# Altium footprint library CONN_B2B.PcbLib: 27 footprints (part 3 of 3)
Each footprint in its own frame and in the unit in brackets; x right, y up, seen from the top. Pads: shape width x height; smd on the part's side, far side on the other; paste and mask are expansions set on the pad; w line width, h text height; cw(c..) or ccw(c..) is an arc to the next point about the centre after c.
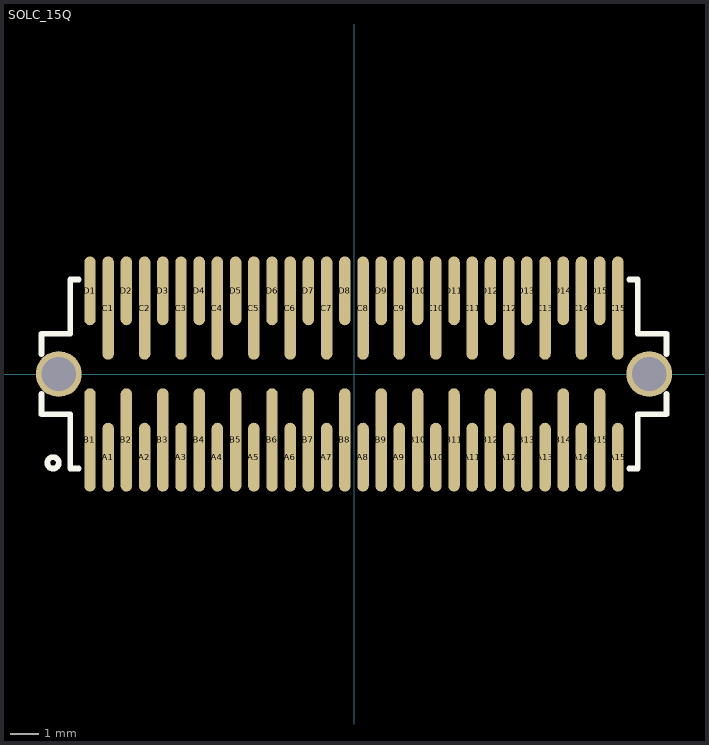
[diagram p2: the footprint, top view; thin cyan lines are the x and y axes]

## SOLC_15Q [mm] "SAMTEC SOLC-115-02-S-Q-LC"
height 0.6
pads (62):
  oval 0.4x2.4 smd: A1(-8.575,-2.9) A2(-7.305,-2.9) A3(-6.035,-2.9) A4(-4.765,-2.9) A5(-3.495,-2.9) A6(-2.225,-2.9) A7(-0.955,-2.9) A8(0.315,-2.9) A9(1.585,-2.9) A10(2.855,-2.9) A11(4.125,-2.9) A12(5.395,-2.9) A13(6.665,-2.9) A14(7.935,-2.9) A15(9.205,-2.9) D1(-9.21,2.9) D2(-7.94,2.9) D3(-6.67,2.9) D4(-5.4,2.9) D5(-4.13,2.9) D6(-2.86,2.9) D7(-1.59,2.9) D8(-0.32,2.9) D9(0.95,2.9) D10(2.22,2.9) D11(3.49,2.9) D12(4.76,2.9) D13(6.03,2.9) D14(7.3,2.9) D15(8.57,2.9)
  oval 0.4x3.6 smd: B1(-9.21,-2.3) B2(-7.94,-2.3) B3(-6.67,-2.3) B4(-5.4,-2.3) B5(-4.13,-2.3) B6(-2.86,-2.3) B7(-1.59,-2.3) B8(-0.32,-2.3) B9(0.95,-2.3) B10(2.22,-2.3) B11(3.49,-2.3) B12(4.76,-2.3) B13(6.03,-2.3) B14(7.3,-2.3) B15(8.57,-2.3) C1(-8.575,2.3) C2(-7.305,2.3) C3(-6.035,2.3) C4(-4.765,2.3) C5(-3.495,2.3) C6(-2.225,2.3) C7(-0.955,2.3) C8(0.315,2.3) C9(1.585,2.3) C10(2.855,2.3) C11(4.125,2.3) C12(5.395,2.3) C13(6.665,2.3) C14(7.935,2.3) C15(9.205,2.3)
  round 1.6 / inner round 1.5 / far side oval 1.6x2.5 hole 1.2: ""(-10.3,0) ""(10.3,0)
Top Overlay:
  circle w0.2: c-10.5,-3.1 r0.2
  lines w0.2: -10.9,-0.7 -10.9,-1.4 -9.9,-1.4 -9.9,-3.3 -9.6,-3.3 ; -10.9,0.7 -10.9,1.4 -9.9,1.4 -9.9,3.3 -9.6,3.3 ; 9.6,-3.3 9.9,-3.3 9.9,-1.4 10.9,-1.4 10.9,-0.7 ; 9.6,3.3 9.9,3.3 9.9,1.4 10.9,1.4 10.9,0.7
3D body "SOLC-115-02-S-Q-LC.stp": height 4.56, standoff -1.41, extent -10.795,-3.556 10.795,3.556